# Altium footprint library main.PcbLib: 208 footprints (part 9 of 13)
Each footprint in its own frame and in the unit in brackets; x right, y up, seen from the top. Pads: shape width x height; smd on the part's side, far side on the other; paste and mask are expansions set on the pad; w line width, h text height; cw(c..) or ccw(c..) is an arc to the next point about the centre after c.
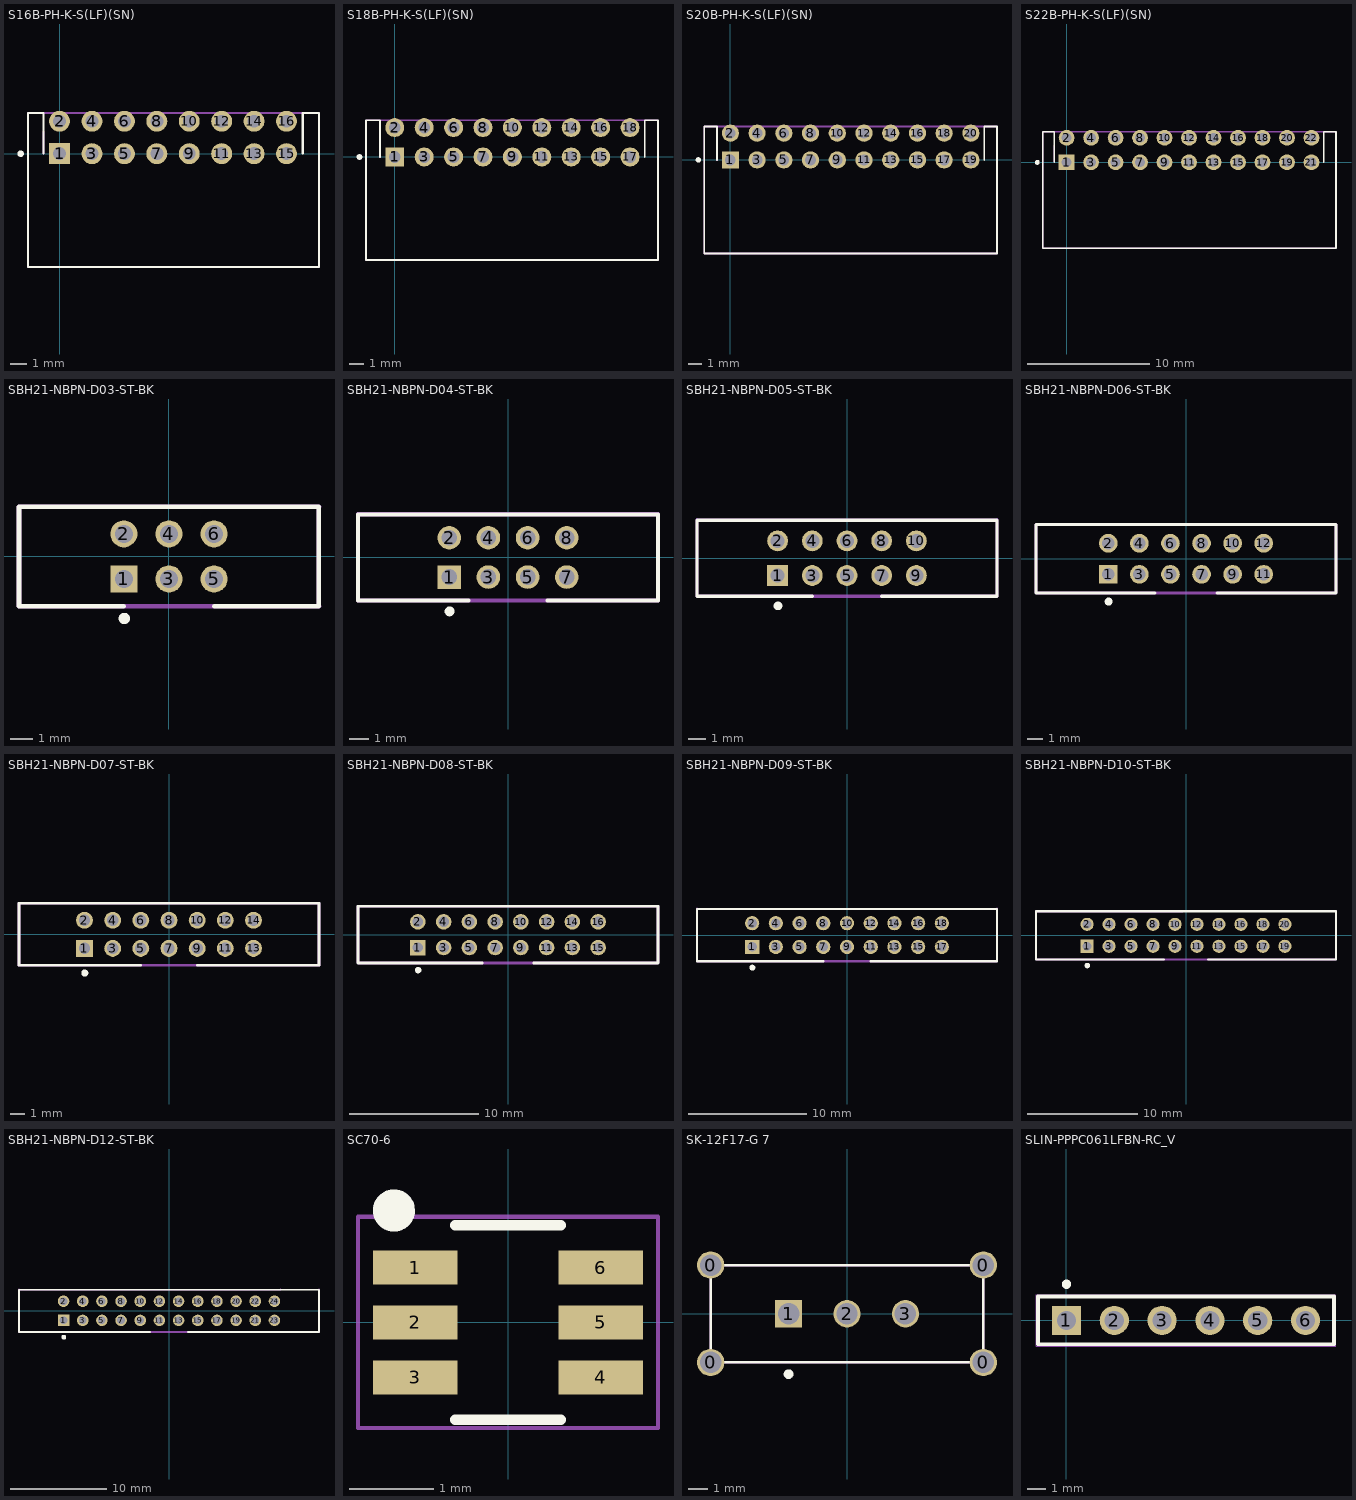
[diagram p8: the footprints below, top view; thin cyan lines are the x and y axes]

## S16B-PH-K-S(LF)(SN) [mm] "S16B-PH-K-S(LF)(SN)"
height 1.8
pads (16):
  rect 1.29x1.29 hole 0.8: 1(0,0)
  round 1.29 hole 0.8: 2(0,2) 3(2,0) 4(2,2) 5(4,0) 6(4,2) 7(6,0) 8(6,2) 9(8,0) 10(8,2) 11(10,0) 12(10,2) 13(12,0) 14(12,2) 15(14,0) 16(14,2)
Top Overlay:
  circle w0.2: c-2.4,0 r0.1
  lines w0.127: -1,0 -1,2.5 -1.95,2.5 -1.95,-7 16,-7 16,2.5 15,2.5 15,0
Mechanical 7:
  text ".Designator" at -1.195,-4.27 h1.52
Mechanical 15:
  lines w0.127: -1,0 -1,1.35 ; -1.95,-7 -1.95,2.5 16.001,2.5 15.997,-7 -1.95,-7
3D body "S16B-PHDSS.STEP": height 5, standoff -3, extent -1.95,-6.95 15.95,2.55

## S18B-PH-K-S(LF)(SN) [mm] "S18B-PH-K-S(LF)(SN)"
height 1.8
pads (18):
  rect 1.29x1.29 hole 0.8: 1(0,0)
  round 1.29 hole 0.8: 2(0,2) 3(2,0) 4(2,2) 5(4,0) 6(4,2) 7(6,0) 8(6,2) 9(8,0) 10(8,2) 11(10,0) 12(10,2) 13(12,0) 14(12,2) 15(14,0) 16(14,2) 17(16,0) 18(16,2)
Top Overlay:
  circle w0.2: c-2.4,0 r0.1
  lines w0.127: -1,0 -1,2.5 -1.95,2.5 -1.95,-7 17.9,-7 17.9,2.5 17,2.5 17,0
Mechanical 7:
  text ".Designator" at -1.195,-4.27 h1.52
Mechanical 15:
  lines w0.127: -1,0 -1,1.35 ; -1.95,-7 -1.95,2.5 17.902,2.5 17.898,-7 -1.95,-7
3D body "S18B-PHDSS.STEP": height 5, standoff -3, extent -2,-7 17.9,2.5

## S20B-PH-K-S(LF)(SN) [mm] "S20B-PH-K-S(LF)(SN)"
height 1.8
pads (20):
  rect 1.29x1.29 hole 0.8: 1(0,0)
  round 1.29 hole 0.8: 2(0,2) 3(2,0) 4(2,2) 5(4,0) 6(4,2) 7(6,0) 8(6,2) 9(8,0) 10(8,2) 11(10,0) 12(10,2) 13(12,0) 14(12,2) 15(14,0) 16(14,2) 17(16,0) 18(16,2) 19(18,0) 20(18,2)
Top Overlay:
  circle w0.2: c-2.4,0 r0.1
  lines w0.127: -1,0 -1,2.5 -1.95,2.5 -1.95,-7 19.95,-7 19.95,2.5 19,2.5 19,0
Mechanical 7:
  text ".Designator" at -1.195,-4.27 h1.52
Mechanical 15:
  lines w0.127: -1,0 -1,1.35 ; 19.93,-7 -1.95,-7 -1.95,2.5 19.95,2.5 ; 19.95,-7 19.954,2.5
3D body "S20B-PHDSS.STEP": height 5, standoff -3, extent -1.95,-7 19.95,2.5

## S22B-PH-K-S(LF)(SN) [mm] "S22B-PH-K-S(LF)(SN)"
height 1.8
pads (22):
  rect 1.29x1.29 hole 0.8: 1(0,0)
  round 1.29 hole 0.8: 2(0,2) 3(2,0) 4(2,2) 5(4,0) 6(4,2) 7(6,0) 8(6,2) 9(8,0) 10(8,2) 11(10,0) 12(10,2) 13(12,0) 14(12,2) 15(14,0) 16(14,2) 17(16,0) 18(16,2) 19(18,0) 20(18,2) 21(20,0) 22(20,2)
Top Overlay:
  circle w0.2: c-2.4,0 r0.1
  lines w0.127: -1,0 -1,2.5 -1.95,2.5 -1.95,-7 22,-7 22,2.5 21,2.5 21,0
Mechanical 7:
  text ".Designator" at -1.195,-4.27 h1.52
Mechanical 15:
  lines w0.127: -1,0 -1,1.35 ; -1.95,-7 -1.95,2.5 22.001,2.5 21.998,-7 -1.95,-7
3D body "S22B-PHDSS.STEP": height 5, standoff -3, extent -2,-7 21.9,2.5

## SBH21-NBPN-D03-ST-BK [mm] "SBH21-NBPN-D03-ST-BK"
height 5.4
pads (6):
  rect 1.2x1.2 hole 0.8 paste-1000 mask+0: 1(-2,-1)
  round 1.2 hole 0.8 paste-1000 mask+0: 2(-2,1) 3(0,-1) 4(0,1) 5(2,-1) 6(2,1)
Top Overlay:
  circle w0.25: c-1.98,-2.75 r0.125
  lines w0.2: -6.65,-2.2 -6.65,2.2 ; -6.645,-2.2 -2,-2.2 ; -6.645,2.2 6.645,2.2 ; 2,-2.2 6.645,-2.205 ; 6.65,-2.2 6.65,2.2
Mechanical 7:
  text ".Designator" at -3.94,-1.63 h1.52
Mechanical 13:
  lines w0.2: 6.65,-2.2 6.65,2.2 ; 6.655,-2.2 -6.65,-2.2 -6.65,2.2 6.655,2.2
Mechanical 15:
  lines w0.2: -6.65,-2.2 -6.65,2.205 6.65,2.205 6.65,-2.2 -6.65,-2.2
3D body: height 5.6, standoff 0, extent -6.65,-2.2 6.65,2.2

## SBH21-NBPN-D04-ST-BK [mm] "SBH21-NBPN-D04-ST-BK"
height 5.4
pads (8):
  rect 1.2x1.2 hole 0.8 paste-1000 mask+0: 1(-3,-1)
  round 1.2 hole 0.8 paste-1000 mask+0: 2(-3,1) 3(-1,-1) 4(-1,1) 5(1,-1) 6(1,1) 7(3,-1) 8(3,1)
Top Overlay:
  circle w0.25: c-2.98,-2.75 r0.125
  lines w0.2: -7.65,-2.2 -7.65,2.2 ; -7.645,-2.2 -2,-2.2 ; -7.645,2.2 7.645,2.2 ; 2,-2.2 7.645,-2.205 ; 7.65,-2.2 7.65,2.2
Mechanical 7:
  text ".Designator" at -4.94,-1.63 h1.52
Mechanical 13:
  lines w0.2: 5.655,-2.2 -7.65,-2.2 -7.65,2.2 7.65,2.2 7.65,-2.2
Mechanical 15:
  lines w0.2: -7.65,-2.2 7.65,-2.2 7.65,2.205 -7.65,2.205 -7.65,-2.2
3D body: height 5.6, standoff 0, extent -7.65,-2.2 7.65,2.2

## SBH21-NBPN-D05-ST-BK [mm] "SBH21-NBPN-D05-ST-BK"
height 5.4
pads (10):
  rect 1.2x1.2 hole 0.8 paste-1000 mask+0: 1(-4,-1)
  round 1.2 hole 0.8 paste-1000 mask+0: 2(-4,1) 3(-2,-1) 4(-2,1) 5(0,-1) 6(0,1) 7(2,-1) 8(2,1) 9(4,-1) 10(4,1)
Top Overlay:
  circle w0.25: c-3.98,-2.75 r0.125
  lines w0.2: -8.65,-2.2 -8.65,2.2 ; -8.645,-2.2 -2,-2.2 ; -8.645,2.2 8.65,2.2 8.65,-2.2 ; 2,-2.2 8.65,-2.205
Mechanical 7:
  text ".Designator" at -5.94,-1.63 h1.52
Mechanical 13:
  lines w0.2: 4.655,2.2 -8.65,2.2 -8.65,-2.2 8.65,-2.2 8.65,2.2
Mechanical 15:
  lines w0.2: -8.65,2.2 8.65,2.205 8.65,-2.2 -8.65,-2.2 -8.65,2.205
3D body: height 5.6, standoff 0, extent -8.65,-2.2 8.65,2.2

## SBH21-NBPN-D06-ST-BK [mm] "SBH21-NBPN-D06-ST-BK"
height 5.4
pads (12):
  rect 1.2x1.2 hole 0.8 paste-1000 mask+0: 1(-5,-1)
  round 1.2 hole 0.8 paste-1000 mask+0: 2(-5,1) 3(-3,-1) 4(-3,1) 5(-1,-1) 6(-1,1) 7(1,-1) 8(1,1) 9(3,-1) 10(3,1) 11(5,-1) 12(5,1)
Top Overlay:
  circle w0.25: c-4.98,-2.75 r0.125
  lines w0.2: -9.65,-2.2 -9.65,2.2 9.65,2.2 9.65,-2.2 2,-2.2 ; -9.645,-2.2 -2,-2.2
Mechanical 7:
  text ".Designator" at -6.94,-1.63 h1.52
Mechanical 13:
  lines w0.2: 3.655,2.2 -9.65,2.2 -9.65,-2.2 9.65,-2.2 9.65,2.2
Mechanical 15:
  lines w0.2: -9.65,2.2 9.65,2.206 9.65,-2.2 -9.65,-2.2 -9.65,2.205
3D body: height 5.6, standoff 0, extent -9.65,-2.2 9.65,2.2

## SBH21-NBPN-D07-ST-BK [mm] "SBH21-NBPN-D07-ST-BK"
height 5.4
pads (14):
  rect 1.2x1.2 hole 0.8 paste-1000 mask+0: 1(-6,-1)
  round 1.2 hole 0.8 paste-1000 mask+0: 2(-6,1) 3(-4,-1) 4(-4,1) 5(-2,-1) 6(-2,1) 7(0,-1) 8(0,1) 9(2,-1) 10(2,1) 11(4,-1) 12(4,1) 13(6,-1) 14(6,1)
Top Overlay:
  circle w0.25: c-5.98,-2.75 r0.125
  lines w0.2: -10.65,-2.2 -10.65,2.2 10.65,2.2 10.65,-2.2 2,-2.2 ; -10.645,-2.2 -2,-2.2
Mechanical 7:
  text ".Designator" at -7.94,-1.63 h1.52
Mechanical 13:
  lines w0.2: 2.655,2.2 -10.65,2.2 -10.65,-2.2 10.65,-2.2 10.65,2.2
Mechanical 15:
  lines w0.2: -10.65,2.2 10.65,2.206 10.65,-2.2 -10.65,-2.2 -10.65,2.205
3D body: height 5.6, standoff 0, extent -10.65,-2.2 10.65,2.2

## SBH21-NBPN-D08-ST-BK [mm] "SBH21-NBPN-D08-ST-BK"
height 5.4
pads (16):
  rect 1.2x1.2 hole 0.8 paste-1000 mask+0: 1(-7,-1)
  round 1.2 hole 0.8 paste-1000 mask+0: 2(-7,1) 3(-5,-1) 4(-5,1) 5(-3,-1) 6(-3,1) 7(-1,-1) 8(-1,1) 9(1,-1) 10(1,1) 11(3,-1) 12(3,1) 13(5,-1) 14(5,1) 15(7,-1) 16(7,1)
Top Overlay:
  circle w0.25: c-6.98,-2.75 r0.125
  lines w0.2: -11.65,-2.2 -11.65,2.2 11.65,2.2 11.65,-2.2 2,-2.2 ; -11.645,-2.2 -2,-2.2
Mechanical 7:
  text ".Designator" at -8.94,-1.63 h1.52
Mechanical 13:
  lines w0.2: 1.655,2.2 -11.65,2.2 -11.65,-2.2 11.65,-2.2 11.65,2.2
Mechanical 15:
  lines w0.2: -11.65,2.2 11.65,2.207 11.65,-2.2 -11.65,-2.2 -11.65,2.205
3D body: height 5.6, standoff 0, extent -11.65,-2.2 11.65,2.2

## SBH21-NBPN-D09-ST-BK [mm] "SBH21-NBPN-D09-ST-BK"
height 5.4
pads (18):
  rect 1.2x1.2 hole 0.8 paste-1000 mask+0: 1(-8,-1)
  round 1.2 hole 0.8 paste-1000 mask+0: 2(-8,1) 3(-6,-1) 4(-6,1) 5(-4,-1) 6(-4,1) 7(-2,-1) 8(-2,1) 9(0,-1) 10(0,1) 11(2,-1) 12(2,1) 13(4,-1) 14(4,1) 15(6,-1) 16(6,1) 17(8,-1) 18(8,1)
Top Overlay:
  circle w0.25: c-7.98,-2.75 r0.125
  lines w0.2: -12.65,-2.2 -12.65,2.2 12.65,2.2 12.65,-2.2 2,-2.2 ; -12.645,-2.2 -2,-2.2
Mechanical 7:
  text ".Designator" at -9.94,-1.63 h1.52
Mechanical 13:
  lines w0.2: 0.655,2.2 -12.65,2.2 -12.65,-2.2 12.65,-2.2 12.65,2.2
Mechanical 15:
  lines w0.2: -12.65,2.2 12.65,2.207 12.65,-2.2 -12.65,-2.2 -12.65,2.205
3D body: height 5.6, standoff 0, extent -12.65,-2.2 12.65,2.2

## SBH21-NBPN-D10-ST-BK [mm] "SBH21-NBPN-D10-ST-BK"
height 5.4
pads (20):
  rect 1.2x1.2 hole 0.8 paste-1000 mask+0: 1(-9,-1)
  round 1.2 hole 0.8 paste-1000 mask+0: 2(-9,1) 3(-7,-1) 4(-7,1) 5(-5,-1) 6(-5,1) 7(-3,-1) 8(-3,1) 9(-1,-1) 10(-1,1) 11(1,-1) 12(1,1) 13(3,-1) 14(3,1) 15(5,-1) 16(5,1) 17(7,-1) 18(7,1) 19(9,-1) 20(9,1)
Top Overlay:
  circle w0.25: c-8.98,-2.75 r0.125
  lines w0.2: -13.65,-2.2 -13.65,2.2 13.65,2.2 13.65,-2.2 2,-2.2 ; -13.645,-2.2 -2,-2.2
Mechanical 7:
  text ".Designator" at -10.94,-1.63 h1.52
Mechanical 13:
  lines w0.2: -0.345,2.2 -13.65,2.2 -13.65,-2.2 13.65,-2.2 13.65,2.2
Mechanical 15:
  lines w0.2: -13.65,2.2 13.65,2.208 13.65,-2.2 -13.65,-2.2 -13.65,2.205
3D body: height 5.6, standoff 0, extent -13.65,-2.2 13.65,2.2

## SBH21-NBPN-D12-ST-BK [mm] "SBH21-NBPN-D12-ST-BK"
height 5.4
pads (24):
  rect 1.2x1.2 hole 0.8 paste-1000 mask+0: 1(-11,-1)
  round 1.2 hole 0.8 paste-1000 mask+0: 2(-11,1) 3(-9,-1) 4(-9,1) 5(-7,-1) 6(-7,1) 7(-5,-1) 8(-5,1) 9(-3,-1) 10(-3,1) 11(-1,-1) 12(-1,1) 13(1,-1) 14(1,1) 15(3,-1) 16(3,1) 17(5,-1) 18(5,1) 19(7,-1) 20(7,1) 21(9,-1) 22(9,1) 23(11,-1) 24(11,1)
Top Overlay:
  circle w0.25: c-10.98,-2.75 r0.125
  lines w0.2: -15.65,-2.2 -15.65,2.2 15.65,2.2 15.65,-2.2 2,-2.2 ; -15.645,-2.2 -2,-2.2
Mechanical 7:
  text ".Designator" at -12.94,-1.63 h1.52
Mechanical 13:
  lines w0.2: -2.345,2.2 -15.65,2.2 -15.65,-2.2 11.65,-2.2 ; 15.65,-2.2 15.65,2.2
Mechanical 15:
  lines w0.2: -15.65,2.2 11.65,2.208 ; -15.65,2.205 -15.65,-2.2 11.65,-2.2 ; 15.65,-2.2 15.65,2.208
3D body: height 5.6, standoff 0, extent -15.65,-2.2 15.65,2.2

## SC70-6 [mm]
pads (6):
  rect 1x0.4 smd: 1(-1.1,0.65) 2(-1.1,0) 3(-1.1,-0.65) 4(1.1,-0.65) 5(1.1,0) 6(1.1,0.65)
Top Overlay:
  lines w0.127: -0.625,-1.15 0.625,-1.15 ; -0.625,1.15 0.625,1.15
  lines w0.25: -1.234,1.371 ccw(c-1.35,1.325) -1.225,1.325
Mechanical 7:
  text ".Designator" at -1.016,-0.381 h0.76
Mechanical 15:
  lines w0.05: -1.775,-1.25 1.775,-1.25 1.775,1.25 -1.775,1.25 -1.775,-1.25
3D body "User Library-SOT363-2.STEP": height 1.1, standoff 0, extent -1.2,-1.1 1.2,1.1

## SK-12F17-G 7 [mm] "SK-12F17-G 7"
height 8
pads (7):
  round 1.4 hole 1.1: 0(-7,-2.5) 0(-7,2.5) 0(7,-2.5) 0(7,2.5) 2(0,0) 3(3,0)
  rect 1.4x1.4 hole 1.1: 1(-3,0)
Top Overlay:
  circle w0.25: c-3,-3.1 r0.125
  lines w0.127: -7,-2.5 7,-2.5 7,2.5 -7,2.5 -7,-2.5
Mechanical 7:
  text ".Designator" at -4.3,-0.572 h1.52
Mechanical 13:
  lines w0.127: -7,-2.5 -7,2.5 7,2.5 7,-2.5 -7,-2.5
Mechanical 15:
  lines w0.05: -7,-2.5 -7,2.5 7,2.5 7,-2.5 -7,-2.5
3D body: height 8, standoff 0, extent -7,-2.5 7,2.5

## SLIN-PPPC061LFBN-RC_V [mm] "THD, 6-Leads"
height 8.5
pads (6):
  rect 1.55x1.55 hole 1.02: 1(0,0)
  round 1.55 hole 1.02: 2(2.54,0) 3(5.08,0) 4(7.62,0) 5(10.16,0) 6(12.7,0)
Top Overlay:
  circle w0.25: c0,1.92 r0.125
  lines w0.2: -1.52,-1.27 -1.52,1.27 14.22,1.27 14.22,-1.27 -1.52,-1.27
Mechanical 7:
  text ".Designator" at 1.006,-0.677 h1.52
Mechanical 15:
  lines w0.05: -1.62,-1.37 -1.62,1.37 14.32,1.37 14.32,-1.37 -1.62,-1.37
3D body "User Library-zl262-6s_p2-54_l15-74_w2-54_h8-5.STEP": height 8.5, standoff -3, extent -1.52,-1.27 14.22,1.27